# Altium footprint library Connectors.PcbLib: 60 footprints (part 4 of 4)
Each footprint in its own frame and in the unit in brackets; x right, y up, seen from the top. Pads: shape width x height; smd on the part's side, far side on the other; paste and mask are expansions set on the pad; w line width, h text height; cw(c..) or ccw(c..) is an arc to the next point about the centre after c.
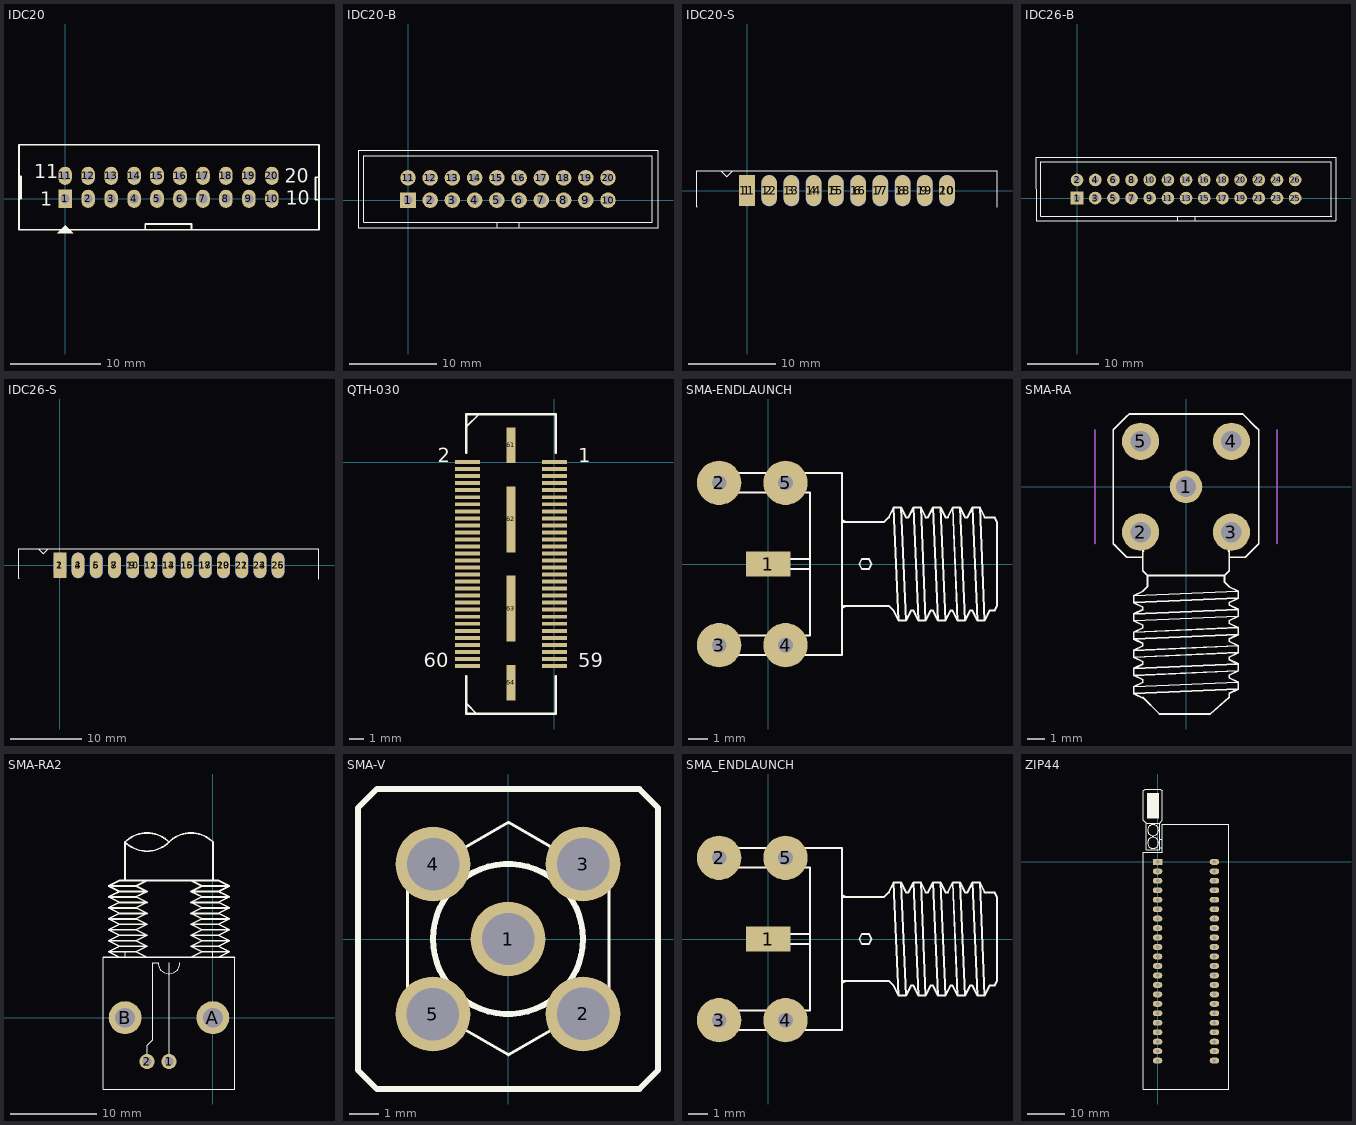
[diagram p3: the footprints below, top view; thin cyan lines are the x and y axes]

## IDC20 [mm] "Header 10x2,20 pin, connecter"
height 7.62
pads (20):
  rect 1.5x2 hole 1: 1(0,0)
  oval 1.5x2 hole 1: 2(2.54,0) 3(5.08,0) 4(7.62,0) 5(10.16,0) 6(12.7,0) 7(15.24,0) 8(17.78,0) 9(20.32,0) 10(22.86,0) 11(0,2.54) 12(2.54,2.54) 13(5.08,2.54) 14(7.62,2.54) 15(10.16,2.54) 16(12.7,2.54) 17(15.24,2.54) 18(17.78,2.54) 19(20.32,2.54) 20(22.86,2.54)
Top Overlay:
  region: 0,-2.921 -0.889,-3.81 0.889,-3.81
  lines w0.178: -5.1,-0.025 -5.075,0 -4.875,0 -4.875,2.475 -5.1,2.475 ; 8.875,-3.394 8.875,-2.794 13.975,-2.794 13.975,-3.344 14.025,-3.394 ; 27.94,-0.127 27.686,-0.127 27.686,2.398 27.94,2.398 ; -5.1,-3.429 28.067,-3.429 28.067,5.969 -5.1,5.969 -5.1,-3.429
  text "20" at 24.257,1.778 h1.52
  text "10" at 24.384,-0.635 h1.52
  text "11" at -3.429,2.286 h1.52
  text "1" at -2.775,-0.75 h1.52
3D body "20 vuong.step": height 9.1, standoff -3, extent -5.094,-3.407 28.106,5.893

## IDC20-B [mil]
pads (20):
  rect 70x70 hole 40: 1(0,0)
  round 70 hole 40: 2(100,0) 3(200,0) 4(300,0) 5(400,0) 6(500,0) 7(600,0) 8(700,0) 9(800,0) 10(900,0) 11(0,100) 12(100,100) 13(200,100) 14(300,100) 15(400,100) 16(500,100) 17(600,100) 18(700,100) 19(800,100) 20(900,100)
Top Overlay:
  lines w4: 150,-100 1100,-100 1100,200 -200,200 -200,-100 250,-100 ; 400,-125 400,-100 ; 500,-125 500,-100 ; -225,-125 1125,-125 1125,225 -225,225 -225,-125
3D body: height 358.27, standoff 0, extent -224.5,-125 1125,225
3D body: height 102.36, standoff 0, extent -225,-125 1124.5,225
3D body: height 300, standoff -120, extent -12.5,87.5 12.5,112.5
3D body: height 300, standoff -120, extent 87.5,87.5 112.5,112.5
3D body: height 300, standoff -120, extent 187.5,87.5 212.5,112.5
3D body: height 300, standoff -120, extent 287.5,87.5 312.5,112.5
3D body: height 300, standoff -120, extent 387.5,87.5 412.5,112.5
3D body: height 300, standoff -120, extent 387.5,-12.5 412.5,12.5
3D body: height 300, standoff -120, extent 287.5,-12.5 312.5,12.5
3D body: height 300, standoff -120, extent 187.5,-12.5 212.5,12.5
3D body: height 300, standoff -120, extent 87.5,-12.5 112.5,12.5
3D body: height 300, standoff -120, extent -12.5,-12.5 12.5,12.5
3D body: height 300, standoff -120, extent 487.5,-12.5 512.5,12.5
3D body: height 300, standoff -120, extent 487.5,87.5 512.5,112.5
3D body: height 300, standoff -120, extent 587.5,-12.5 612.5,12.5
3D body: height 300, standoff -120, extent 587.5,87.5 612.5,112.5
3D body: height 300, standoff -120, extent 687.5,87.5 712.5,112.5
3D body: height 300, standoff -120, extent 687.5,-12.5 712.5,12.5
3D body: height 300, standoff -120, extent 787.5,-12.5 812.5,12.5
3D body: height 300, standoff -120, extent 787.5,87.5 812.5,112.5
3D body: height 300, standoff -120, extent 887.5,-12.5 912.5,12.5
3D body: height 300, standoff -120, extent 887.5,87.5 912.5,112.5

## IDC20-S [mil] "IDC20 EDGE SOLDERED"
pads (20):
  rect 70x140 smd: 1(0,0)
  oval 70x140 smd: 2(100,0) 3(200,0) 4(300,0) 5(400,0) 6(500,0) 7(600,0) 8(700,0) 9(800,0) 10(900,0)
  oval 70x140 smd far side: 11(0,0) 12(100,0) 13(200,0) 14(300,0) 15(400,0) 16(500,0) 17(600,0) 18(700,0) 19(800,0) 20(900,0)
Top Overlay:
  lines w4: -119,90 -92,63 -65,90 ; 1125,-75 1125,90 -225,90 -225,-72 ; -225,-72 -225,-72
3D body: height 30, standoff 10, extent 587.5,-72.5 612.5,401.5
3D body: height 30, standoff 10, extent 487.5,-72.5 512.5,401.5
3D body: height 30, standoff 10, extent 487.5,-72.5 512.5,401.5
3D body: height 30, standoff 10, extent 587.5,-72.5 612.5,401.5
3D body: height 150, standoff 120, extent -225.5,97.5 1125,440.5
3D body: height 150, standoff -150, extent -224.5,97.5 -186,441
3D body: height 150, standoff -150, extent -224.5,97.5 1125,183
3D body: height 150, standoff 120, extent -224.5,97.5 1125,441
3D body: height 30, standoff 10, extent 387.5,-72.5 412.5,401.5
3D body: height 30, standoff 10, extent 287.5,-72.5 312.5,401.5
3D body: height 30, standoff 10, extent 187.5,-72.5 212.5,401.5
3D body: height 30, standoff 10, extent 87.5,-72.5 112.5,401.5
3D body: height 30, standoff 10, extent -12.5,-72.5 12.5,401.5
3D body: height 30, standoff 10, extent -12.5,-72.5 12.5,401.5
3D body: height 30, standoff 10, extent 87.5,-72.5 112.5,401.5
3D body: height 30, standoff 10, extent 187.5,-72.5 212.5,401.5
3D body: height 30, standoff 10, extent 287.5,-72.5 312.5,401.5
3D body: height 30, standoff 10, extent 387.5,-72.5 412.5,401.5
3D body: height 151, standoff 150, extent -27.75,307 24.75,422
3D body: height 150, standoff -150, extent -224.5,97.5 -186,441
3D body: height 150, standoff -150, extent -224.5,97.5 1125,183
3D body: height 150, standoff -150, extent 1086.5,97.5 1125,441
3D body: height 30, standoff 10, extent 687.5,-72.5 712.5,401.5
3D body: height 30, standoff 10, extent 687.5,-72.5 712.5,401.5
3D body: height 150, standoff -150, extent 1086.5,97.5 1125,441
3D body: height 30, standoff 10, extent 887.5,-72.5 912.5,401.5
3D body: height 30, standoff 10, extent 787.5,-72.5 812.5,401.5
3D body: height 30, standoff 10, extent 787.5,-72.5 812.5,401.5
3D body: height 30, standoff 10, extent 887.5,-72.5 912.5,401.5

## IDC26-B [mil]
pads (26):
  rect 70x70 hole 40: 1(0,0)
  round 70 hole 40: 2(0,100) 3(100,0) 4(100,100) 5(200,0) 6(200,100) 7(300,0) 8(300,100) 9(400,0) 10(400,100) 11(500,0) 12(500,100) 13(600,0) 14(600,100) 15(700,0) 16(700,100) 17(800,0) 18(800,100) 19(900,0) 20(900,100) 21(1000,0) 22(1000,100) 23(1100,0) 24(1100,100) 25(1200,0) 26(1200,100)
Top Overlay:
  lines w4: 150,-100 1400.39,-100 ; 250,-100 -200,-100 -200,200 1399.41,200 ; 550.2,-125 550.2,-100 ; 650.2,-125 650.2,-100 ; 1400,-100 1400,200 ; 1424.41,-125 -225,-125 -225.98,225 1424.41,225 ; 1425,-125 1425,225
3D body: height 300, standoff -120, extent 887.5,87.5 912.5,112.5
3D body: height 300, standoff -120, extent 887.5,-12.5 912.5,12.5
3D body: height 300, standoff -120, extent 787.5,87.5 812.5,112.5
3D body: height 300, standoff -120, extent 787.5,-12.5 812.5,12.5
3D body: height 300, standoff -120, extent 687.5,-12.5 712.5,12.5
3D body: height 300, standoff -120, extent 687.5,87.5 712.5,112.5
3D body: height 300, standoff -120, extent 587.5,87.5 612.5,112.5
3D body: height 300, standoff -120, extent 587.5,-12.5 612.5,12.5
3D body: height 300, standoff -120, extent 487.5,87.5 512.5,112.5
3D body: height 300, standoff -120, extent 487.5,-12.5 512.5,12.5
3D body: height 300, standoff -120, extent -12.5,-12.5 12.5,12.5
3D body: height 300, standoff -120, extent 87.5,-12.5 112.5,12.5
3D body: height 300, standoff -120, extent 187.5,-12.5 212.5,12.5
3D body: height 300, standoff -120, extent 287.5,-12.5 312.5,12.5
3D body: height 300, standoff -120, extent 387.5,-12.5 412.5,12.5
3D body: height 300, standoff -120, extent 387.5,87.5 412.5,112.5
3D body: height 300, standoff -120, extent 287.5,87.5 312.5,112.5
3D body: height 300, standoff -120, extent 187.5,87.5 212.5,112.5
3D body: height 300, standoff -120, extent 87.5,87.5 112.5,112.5
3D body: height 300, standoff -120, extent -12.5,87.5 12.5,112.5
3D body: height 102.36, standoff 0, extent -225,-125 1425,225
3D body: height 358.27, standoff 0, extent -224.5,-125 1425,225
3D body: height 300, standoff -120, extent 987.5,-12.5 1012.5,12.5
3D body: height 300, standoff -120, extent 987.5,87.5 1012.5,112.5
3D body: height 300, standoff -120, extent 1087.5,-12.5 1112.5,12.5
3D body: height 300, standoff -120, extent 1087.5,87.5 1112.5,112.5
3D body: height 300, standoff -120, extent 1187.5,-12.5 1212.5,12.5
3D body: height 300, standoff -120, extent 1187.5,87.5 1212.5,112.5

## IDC26-S [mil] "IDC26 EDGE SOLDERED"
pads (26):
  rect 70x140 smd: 1(0,0)
  oval 70x140 smd far side: 2(0,0) 4(100,0) 6(200,0) 8(300,0) 10(400,0) 12(500,0) 14(600,0) 16(700,0) 18(800,0) 20(900,0) 22(1000,0) 24(1100,0) 26(1200,0)
  oval 70x140 smd: 3(100,0) 5(200,0) 7(300,0) 9(400,0) 11(500,0) 13(600,0) 15(700,0) 17(800,0) 19(900,0) 21(1000,0) 23(1100,0) 25(1200,0)
Top Overlay:
  lines w4: -119,90 -92,63 -65,90 ; 1425,-75 1425,90 -225,90 -225,-72 ; -225,-72 -225,-72
3D body: height 30, standoff 10, extent 887.5,-72.5 912.5,401.5
3D body: height 30, standoff 10, extent 787.5,-72.5 812.5,401.5
3D body: height 30, standoff 10, extent 787.5,-72.5 812.5,401.5
3D body: height 30, standoff 10, extent 887.5,-72.5 912.5,401.5
3D body: height 30, standoff 10, extent 687.5,-72.5 712.5,401.5
3D body: height 30, standoff 10, extent 687.5,-72.5 712.5,401.5
3D body: height 150, standoff -150, extent -224.5,97.5 1425,183
3D body: height 150, standoff -150, extent -224.5,97.5 -186,441
3D body: height 151, standoff 150, extent -27.75,307 24.75,422
3D body: height 30, standoff 10, extent 387.5,-72.5 412.5,401.5
3D body: height 30, standoff 10, extent 287.5,-72.5 312.5,401.5
3D body: height 30, standoff 10, extent 187.5,-72.5 212.5,401.5
3D body: height 30, standoff 10, extent 87.5,-72.5 112.5,401.5
3D body: height 30, standoff 10, extent -12.5,-72.5 12.5,401.5
3D body: height 30, standoff 10, extent -12.5,-72.5 12.5,401.5
3D body: height 30, standoff 10, extent 87.5,-72.5 112.5,401.5
3D body: height 30, standoff 10, extent 187.5,-72.5 212.5,401.5
3D body: height 30, standoff 10, extent 287.5,-72.5 312.5,401.5
3D body: height 30, standoff 10, extent 387.5,-72.5 412.5,401.5
3D body: height 150, standoff 120, extent -224.5,97.5 1425,441
3D body: height 150, standoff -150, extent -224.5,97.5 1425,183
3D body: height 150, standoff -150, extent -224.5,97.5 -186,441
3D body: height 150, standoff 120, extent -225.5,97.5 1425,440.5
3D body: height 30, standoff 10, extent 587.5,-72.5 612.5,401.5
3D body: height 30, standoff 10, extent 487.5,-72.5 512.5,401.5
3D body: height 30, standoff 10, extent 487.5,-72.5 512.5,401.5
3D body: height 30, standoff 10, extent 587.5,-72.5 612.5,401.5
3D body: height 150, standoff -150, extent 1386.5,97.5 1425,441
3D body: height 30, standoff 10, extent 987.5,-72.5 1012.5,401.5
3D body: height 30, standoff 10, extent 987.5,-72.5 1012.5,401.5
3D body: height 150, standoff -150, extent 1386.5,97.5 1425,441
3D body: height 30, standoff 10, extent 1187.5,-72.5 1212.5,401.5
3D body: height 30, standoff 10, extent 1087.5,-72.5 1112.5,401.5
3D body: height 30, standoff 10, extent 1087.5,-72.5 1112.5,401.5
3D body: height 30, standoff 10, extent 1187.5,-72.5 1212.5,401.5

## QTH-030 [mil]
pads (64):
  rect 70x11 smd: 1(0,0) 2(-243,0) 3(0,-19.7) 4(-243,-19.7) 5(0,-39.4) 6(-243,-39.4) 7(0,-59) 8(-243,-59) 9(0,-78.7) 10(-243,-78.7) 11(0,-98.4) 12(-243,-98.4) 13(0,-118.1) 14(-243,-118.1) 15(0,-137.8) 16(-243,-137.8) 17(0,-157.5) 18(-243,-157.5) 19(0,-177.1) 20(-243,-177.1) 21(0,-196.8) 22(-243,-196.8) 23(0,-216.4) 24(-243,-216.4) 25(0,-236.2) 26(-243,-236.2) 27(0,-255.9) 28(-243,-255.9) 29(0,-275.6) 30(-243,-275.6) 31(0,-295.2) 32(-243,-295.2) 33(0,-314.9) 34(-243,-314.9) 35(0,-334.6) 36(-243,-334.6) 37(0,-354.4) 38(-243,-354.4) 39(0,-374) 40(-243,-374) 41(0,-393.7) 42(-243,-393.7) 43(0,-413.3) 44(-243,-413.3) 45(0,-433) 46(-243,-433) 47(0,-452.7) 48(-243,-452.7) 49(0,-472.4) 50(-243,-472.4) 51(0,-492.1) 52(-243,-492.1) 53(0,-511.8) 54(-243,-511.8) 55(0,-531.4) 56(-243,-531.4) 57(0,-551.1) 58(-243,-551.1) 59(0,-570.8) 60(-243,-570.8)
  rect 25x100 smd: 61(-121.5,47.1) 64(-121.5,-617.9)
  rect 25x185 smd: 62(-121.5,-160.4) 63(-121.5,-410.4)
Top Overlay:
  lines w5: -246.5,-677.17 -244.77,-677.17 -216.54,-705.4 ; -246.5,98.43 -210.33,134.6 -208.66,134.6
  lines w7: -246.5,-600.4 -246.5,-705.4 3.5,-705.4 3.5,-600.4 ; -246.5,25.5 -246.5,134.6 3.5,134.6 3.5,25.5
  text "59" at 66.93,-574.8 h40
  text "60" at -366.14,-574.8 h40
  text "2" at -326.77,0 h40
  text "1" at 66.93,0 h40
3D body "QTH-030-01-X-D-A.step": height 167.88, standoff -29.13, extent -260,-678.75 20,108.75

## SMA-ENDLAUNCH [mil]
pads (5):
  rect 90x50 smd: 1(0,0)
  round 90 hole 30: 2(-100,165) 3(-100,-165) 4(35,-165) 5(35,165)
Top Overlay:
  lines w4: 10,-10 85,-10 ; 10,10 85,10 ; 150,-90 160,-85 ; 150,-85 200,-85 220,-85 225,-85 235,-85 245,-85 255,-95 265,-115 ; 150,85 200,85 220,85 225,85 235,85 245,95 255,115 ; 150,90 160,85 ; 255,115 265,-115 ; 255,115 270,115 ; 265,-115 280,-115 ; 270,115 280,-115 ; 270,115 280,95 285,95 ; 280,-115 290,-95 ; 285,95 295,115 ; 285,95 295,115 ; 290,-95 295,-95 ; 290,-95 295,-95 ; 295,-95 305,-115 ; 295,115 305,-115 ; 295,115 310,115 ; 305,-115 320,-115 ; 310,115 320,-115 ; 310,115 320,95 325,95 335,115 ; 320,-115 330,-95 335,-95 345,-115 ; 335,115 345,-115 ; 335,115 350,115 ; 345,-115 360,-115 ; 350,115 360,-115 ; 350,115 360,95 365,95 375,115 ; 360,-115 370,-95 375,-95 385,-115 ; 375,115 385,-115 ; 375,115 390,115 ; 385,-115 400,-115 ; 390,115 400,-115 ; 390,115 400,95 405,95 415,115 ; 400,-115 410,-95 415,-95 425,-115 ; 415,115 425,-115 ; 415,115 430,115 ; 425,-115 440,-115 ; 430,115 440,-115 ; 430,115 440,95 448.33,95 460,95 465,85 465,53.33 465,-58.33 465,-85 460,-95 450,-95 440,-115 ; -100,-185 150,-185 150,185 85,185 65,185 -100,185 -100,145 85,145 85,-145 -100,-145 -100,-185 ; 185,0 190,-10 205,-10 210,0 205,10 190,10 185,0
3D body "sma-endlaunch.step": height 140, standoff -110, extent -126.5,-120 470.5,130

## SMA-RA [mil]
pads (5):
  round 72 hole 45: 1(0,0)
  round 82 hole 45: 2(-100,-100) 3(100,-100) 4(100,100) 5(-100,100)
Top Overlay:
  lines w4: -155,-130 -160,-125 ; -95,-465 -115,-455 ; -95,-463.33 -58.33,-500 53.33,-500 95,-463.33 95,-455 115,-445 ; -95,-155 -130,-155 -160,-125 ; -93.33,-141.67 -95,-140 -95,-185 -85,-195 ; 93.33,-141.67 95,-140 95,-185 85,-195 ; 95,-155 130,-155 160,-125 160,80 ; 160,75 160,125 155,130 125,160 -125,160 -130,155 -160,125 -160,-125 ; -115,-455 115,-445 ; -115,-455 -115,-440 ; -115,-440 115,-430 ; -115,-440 -95,-430 -95,-425 -115,-415 ; -115,-415 115,-405 ; -115,-415 -115,-400 ; -115,-400 115,-390 ; -115,-400 -95,-390 -95,-385 -115,-375 ; -115,-375 115,-365 ; -115,-375 -115,-360 ; -115,-360 115,-350 ; -115,-360 -95,-350 -95,-345 -115,-335 ; -115,-335 115,-325 ; -115,-335 -115,-320 ; -115,-320 115,-310 ; -115,-320 -95,-310 -95,-305 -115,-295 ; -115,-295 115,-285 ; -115,-295 -115,-280 ; -115,-280 115,-270 ; -115,-280 -95,-270 -95,-265 -115,-255 ; -115,-255 115,-245 ; -115,-255 -115,-240 ; -115,-240 115,-230 ; -115,-240 -95,-230 -85,-220 -85,-210 -85,-200 -85,-195 ; -85,-195 85,-195 ; 85,-195 85,-200 85,-210 95,-220 115,-230 ; 115,-445 115,-430 ; 115,-430 95,-420 95,-415 115,-405 ; 115,-405 115,-390 ; 115,-390 95,-380 95,-375 115,-365 ; 115,-365 115,-350 ; 115,-350 95,-340 95,-335 115,-325 ; 115,-325 115,-310 ; 115,-310 95,-300 95,-295 115,-285 ; 115,-285 115,-270 ; 115,-270 95,-260 95,-255 115,-245 ; 115,-245 115,-230
Mechanical 1:
  lines w4: -200,-125 -200,125 ; 200,-125 200,125
3D body "SMA-J-P-X-RA-TH1.step": height 394.06, standoff -149.25, extent -136.5,-457.49 139.09,137

## SMA-RA2 [mil]
pads (4):
  round 70 hole 40: 1(-200,-200) 2(-300,-200)
  round 150 hole 90: A(0,0) B(-400,0)
Top Overlay:
  lines w4: -400,275 -400,300 ; -325,275 100,275 ; -300,-200 -300,-125 -275,-100 -275,250 -250,250 ccw(c-200,250) -150,250 ; -300,275 -500,275 -500,25 -500,-325 100,-325 100,275 ; -200,-200 -200,200 -200,250 -200,225 ; 0,275 0,300 ; 100,-225 100,275
  lines w8: -500,275 100,275 ; -425,275 -475,300 ; -400.17,799.83 ccw(c-300,900) -199.83,799.83 ; -400.17,800.17 cw(c-300,700) -199.83,800.17 ; -400,625 -400,800 ; -300,275 -350,300 ; -200.17,800.17 cw(c-100,700) 0.17,800.17 ; -100,275 -50,300 ; 0,625 0,800 ; 25,275 75,300 ; -475,300 -350,300 ; -475,300 -425,325 ; -475,350 -350,350 ; -475,350 -425,375 ; -475,350 -425,325 ; -475,400 -350,400 ; -475,400 -425,425 ; -475,400 -425,375 ; -475,450 -350,450 ; -475,450 -425,475 ; -475,450 -425,425 ; -475,500 -350,500 ; -475,500 -425,525 ; -475,500 -425,475 ; -475,550 -350,550 ; -475,550 -425,575 ; -475,550 -425,525 ; -475,600 -350,600 ; -475,600 -425,625 ; -475,600 -425,575 ; -425,325 -300,325 ; -425,375 -300,375 ; -425,425 -300,425 ; -425,475 -300,475 ; -425,525 -300,525 ; -425,575 -300,575 ; -425,625 -300,625 -350,600 ; -425,625 25,625 ; -350,300 -300,325 ; -350,350 -300,375 ; -350,350 -300,325 ; -350,400 -300,425 ; -350,400 -300,375 ; -350,450 -300,475 ; -350,450 -300,425 ; -350,500 -300,525 ; -350,500 -300,475 ; -350,550 -300,575 ; -350,550 -300,525 ; -350,600 -300,575 ; -100,325 25,325 ; -100,325 -50,350 ; -100,325 -50,300 ; -100,375 25,375 ; -100,375 -50,400 ; -100,375 -50,350 ; -100,425 25,425 ; -100,425 -50,450 ; -100,425 -50,400 ; -100,475 25,475 ; -100,475 -50,500 ; -100,475 -50,450 ; -100,525 25,525 ; -100,525 -50,550 ; -100,525 -50,500 ; -100,575 25,575 ; -100,575 -50,600 ; -100,575 -50,550 ; -50,300 75,300 ; -50,350 75,350 ; -50,400 75,400 ; -50,450 75,450 ; -50,500 75,500 ; -50,550 75,550 ; -50,600 75,600 ; -50,600 -100,625 25,625 ; 25,325 75,350 ; 25,325 75,300 ; 25,375 75,400 ; 25,375 75,350 ; 25,425 75,450 ; 25,425 75,400 ; 25,475 75,500 ; 25,475 75,450 ; 25,525 75,550 ; 25,525 75,500 ; 25,575 75,600 ; 25,575 75,550 ; 25,625 75,600
3D body "bnc 3.STEP": height 619.21, standoff -168.19, extent -490.55,-265.59 90.56,1141.89

## SMA-V [mil]
pads (5):
  round 100 hole 70: 1(0,0) 2(100,-100) 3(100,100) 4(-100,100) 5(-100,-100)
Top Overlay:
  circle w8: c0,0 r25
  circle w8: c0,0 r100
  lines w4: -133.69,-76.91 0.55,-154.41 134.78,-76.91 134.78,78.09 0.55,155.59 -133.69,78.09 -133.69,-76.91
  lines w8: -200,-175 -200,150 -200,175 -175,200 175,200 200,175 200,-175 175,-200 -175,-200 -200,-175
3D body "SMA-J-P-X-ST-TH1.step": height 385.54, standoff -145.95, extent -138.3,-136.09 137.3,139.5

## SMA_ENDLAUNCH [mil]
pads (5):
  rect 90x50 smd: 1(0,0)
  round 90 hole 30: 2(-100,165) 3(-100,-165) 4(35,-165) 5(35,165)
Top Overlay:
  lines w4: 10,-10 85,-10 ; 10,10 85,10 ; 150,-90 160,-85 ; 150,-85 200,-85 220,-85 225,-85 235,-85 245,-85 255,-95 265,-115 ; 150,85 200,85 220,85 225,85 235,85 245,95 255,115 ; 150,90 160,85 ; 255,115 270,115 ; 255,115 265,-115 ; 265,-115 280,-115 ; 270,115 280,95 285,95 ; 270,115 280,-115 ; 280,-115 290,-95 ; 285,95 295,115 ; 285,95 295,115 ; 290,-95 295,-95 ; 290,-95 295,-95 ; 295,-95 305,-115 ; 295,115 310,115 ; 295,115 305,-115 ; 305,-115 320,-115 ; 310,115 320,95 325,95 335,115 ; 310,115 320,-115 ; 320,-115 330,-95 335,-95 345,-115 ; 335,115 350,115 ; 335,115 345,-115 ; 345,-115 360,-115 ; 350,115 360,95 365,95 375,115 ; 350,115 360,-115 ; 360,-115 370,-95 375,-95 385,-115 ; 375,115 390,115 ; 375,115 385,-115 ; 385,-115 400,-115 ; 390,115 400,95 405,95 415,115 ; 390,115 400,-115 ; 400,-115 410,-95 415,-95 425,-115 ; 415,115 430,115 ; 415,115 425,-115 ; 425,-115 440,-115 ; 430,115 440,95 448.33,95 460,95 465,85 465,53.33 465,-58.33 465,-85 460,-95 450,-95 440,-115 ; 430,115 440,-115 ; -100,-185 -100,-145 85,-145 85,145 -100,145 -100,185 65,185 85,185 150,185 150,-185 -100,-185 ; 185,0 190,10 205,10 210,0 205,-10 190,-10 185,0
3D body "sma-endlaunch-wide.step": height 155.91, standoff -155.91, extent -103.24,-186 441.24,188.8

## ZIP44 [mil] "40 PIN, W 900 mil , L 2600 mil , Push Pro FOR Chip"
height 300
pads (44):
  rect 100x62 hole 38: 1(0,0)
  oval 100x62 hole 38: 2(0,-100) 3(0,-200) 4(0,-300) 5(0,-400) 6(0,-500) 7(0,-600) 8(0,-700) 9(0,-800) 10(0,-900) 11(0,-1000) 12(0,-1100) 13(0,-1200) 14(0,-1300) 15(0,-1400) 16(0,-1500) 17(0,-1600) 18(0,-1700) 19(0,-1800) 20(0,-1900) 21(0,-2000) 22(0,-2100) 23(600,-2100) 24(600,-2000) 25(600,-1900) 26(600,-1800) 27(600,-1700) 28(600,-1600) 29(600,-1500) 30(600,-1400) 31(600,-1300) 32(600,-1200) 33(600,-1100) 34(600,-1000) 35(600,-900) 36(600,-800) 37(600,-700) 38(600,-600) 39(600,-500) 40(600,-400) 41(600,-300) 42(600,-200) 43(600,-100) 44(600,0)
Top Overlay:
  circle w7: c-48.31,200 r58.31
  circle w7: c-48.31,335 r58.31
  rectangle: -110,460 15,730
  lines w7: 20,150 50,150 ; 20,240 50,240 ; -120,410 20,410 ; -120,410 -150,440 -150,750 -130,770 30,770 50,750 50,440 20,410 ; -120,410 -120,130 -110,130 20,130 20,410 ; -150,-2400 750,-2400 750,400 600,400 50,400 50,100 -150,100 -150,-2400